# Altium schematic symbol library LATTICEPLDS_Library.SchLib: 291 symbols (part 16 of 32)
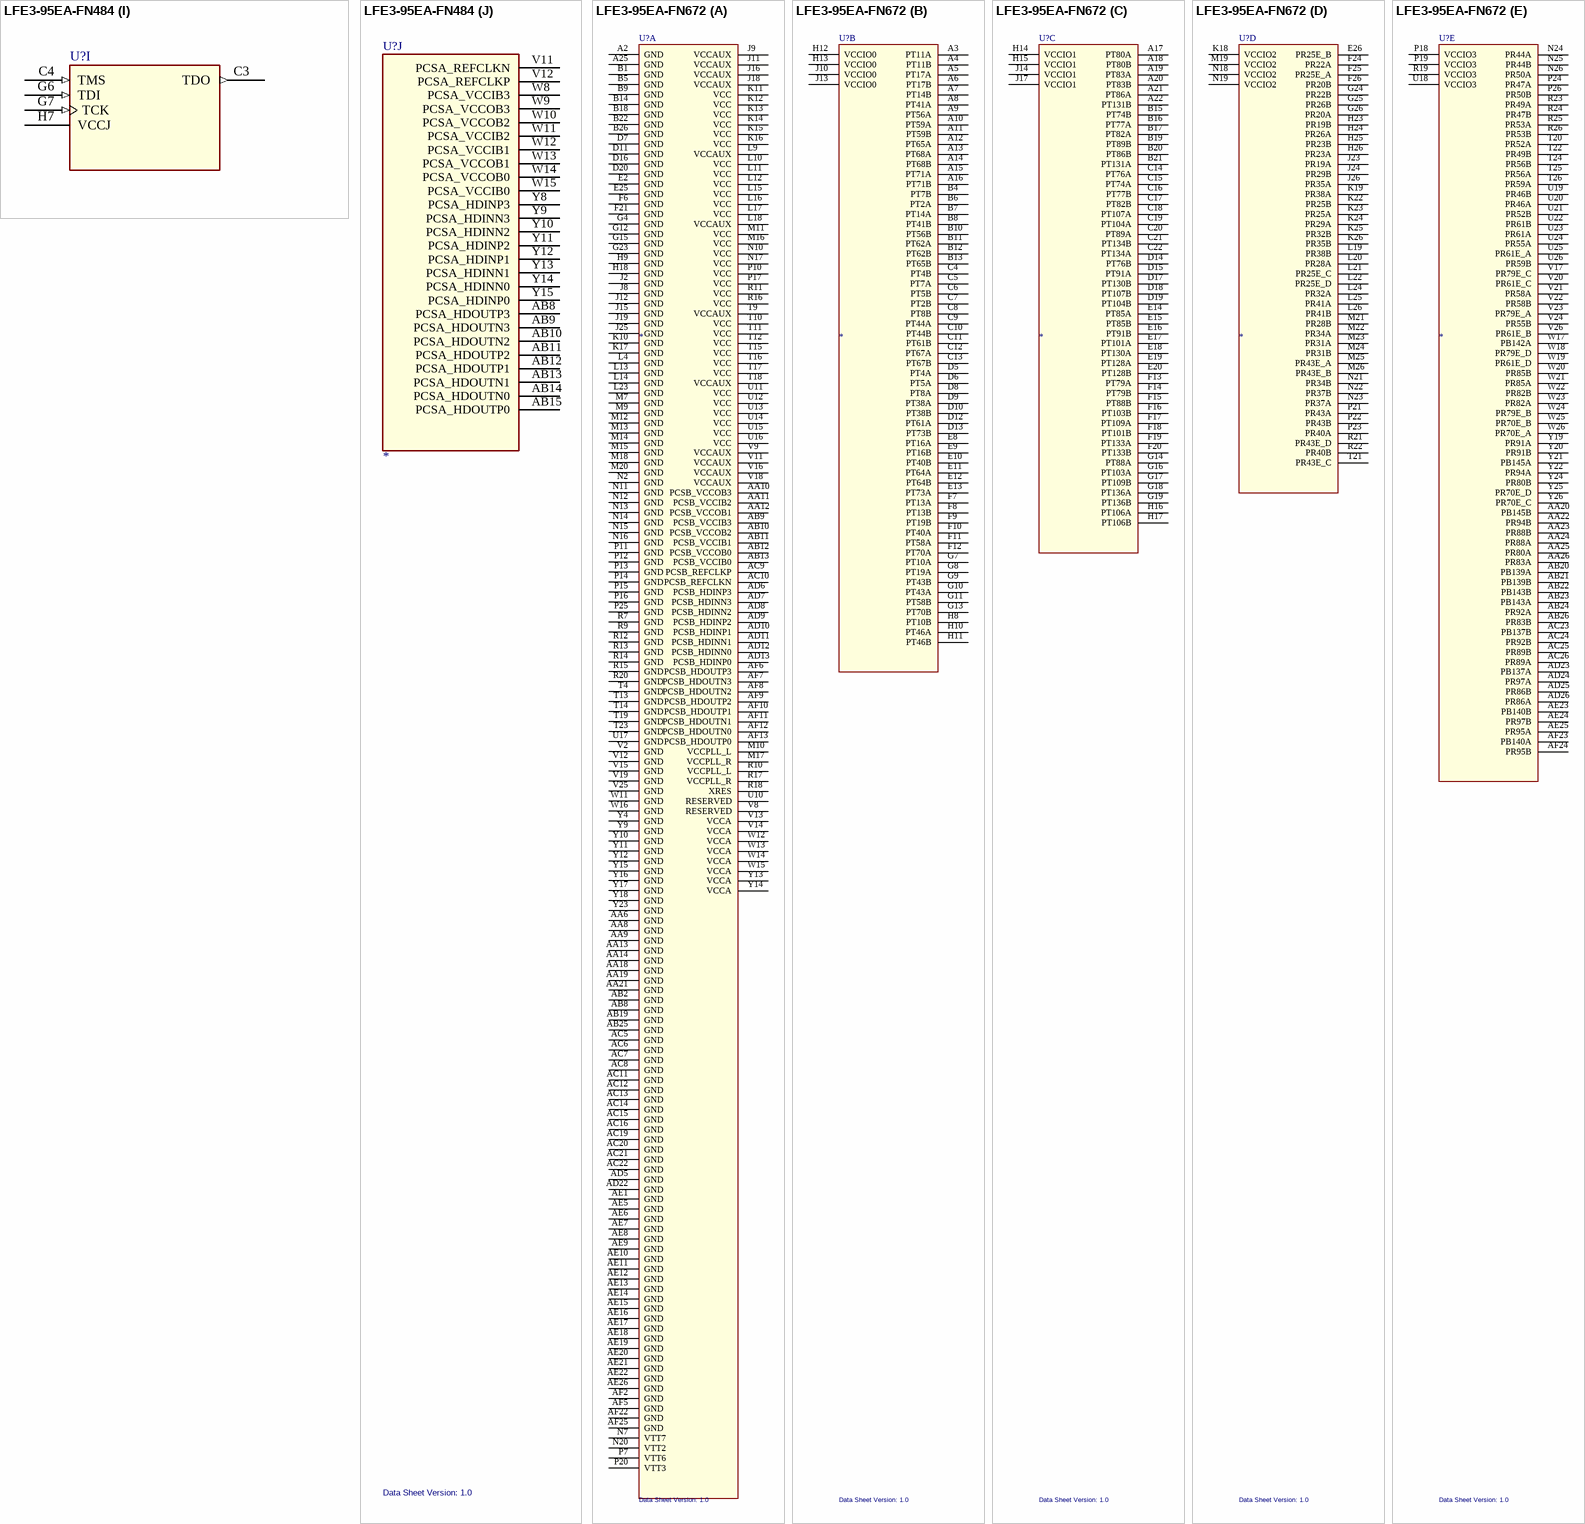
[diagram p318: symbols LFE3-95EA-FN484 to LFE3-95EA-FN672]

## LFE3-95EA-FN484
designator U?  Data Sheet Version: 1.0
SWAP_INFO: (S1+S2+S3+S4+S5+S6+S7+S8+S9+S10); SPLIT_INST: TRUE
part A pins: A1 GND (power), A22 GND (power), AA3 RESERVED, AA7 GND (power), AA8 GND (power), AA9 GND (power), AA10 GND (power), AA11 GND (power), AA12 GND (power), AA13 GND (power), AA14 GND (power), AA15 GND (power), AA16 GND (power), AA18 GND (power), AB1 GND (power), AB2 RESERVED, AB7 GND (power), AB16 GND (power), AB22 GND (power), B5 GND (power), B9 GND (power), B13 GND (power), B17 GND (power), C11 GND (power), C19 GND (power), D3 GND (power), E8 GND (power), E14 GND (power), E21 GND (power), F2 GND (power), F6 GND (power), F17 GND (power), G11 GND (power), G12 GND (power), H8 GND (power), H10 GND (power), H11 VCCAUX, H12 VCCAUX, H13 GND (power), H15 GND (power), H18 GND (power), J5 GND (power), J9 VCC, J10 VCC, J11 VCC, J12 VCC, J13 VCC, J14 VCC, J21 GND (power), K2 GND (power), K8 GND (power), K9 VCCPLL_L, K10 GND (power), K11 GND (power), K12 GND (power), K13 GND (power), K14 VCCPLL_R, K15 GND (power), L6 VTT7 (power), L7 GND (power), L8 VCCAUX, L9 VCC, L10 GND (power), L11 GND (power), L12 GND (power), L13 GND (power), L14 VCC, L15 VCCAUX, L16 GND (power), L17 VTT2 (power), L20 GND (power), M3 GND (power), M6 VTT6 (power), M7 GND (power), M8 VCCAUX, M9 VCC, M10 GND (power), M11 GND (power), M12 GND (power), M13 GND (power), M14 VCC, M15 VCCAUX, M16 GND (power), M17 VTT3 (power), N8 GND (power), N9 VCCPLL_L, N10 GND (power), N11 GND (power), N12 GND (power), N13 GND (power), N14 VCCPLL_R, N15 XRES, N21 GND (power), P2 GND (power), P9 VCC, P10 VCC, P11 VCC, P12 VCC, P13 VCC, P14 VCC, P16 GND (power), P18 GND (power), R5 GND (power), R8 GND (power), R10 GND (power), R11 VCCAUX, R12 VCCAUX, R13 GND (power), R15 GND (power), T10 GND (power), T11 GND (power), T12 GND (power), T13 GND (power), U6 GND (power), U9 GND (power), U10 GND (power), U11 VCCA, U12 VCCA, U13 GND (power), U14 GND (power), U17 GND (power), U21 GND (power), V2 GND (power), V7 GND (power), V8 GND (power), V9 GND (power), V10 VCCA, V13 VCCA, V14 GND (power), V15 GND (power), V16 GND (power), W7 GND (power), W16 GND (power), W20 GND (power), Y4 GND (power), Y7 GND (power), Y16 GND (power)
part B pins: A2 PT8B, A3 PT11A, A4 PT11B, A5 PT14A, A6 PT14B, A7 PT62B, A8 PT65B, A9 PT68A, A10 PT71A, A11 PT71B, B3 PT8A, B4 PT2B, B6 PT5B, B7 PT62A, B8 PT65A, B10 PT68B, C5 PT2A, C6 PT5A, C7 PT56B, C8 PT56A, C9 PT59A, C10 PT59B, D5 PT4B, D6 PT10A, D7 PT10B, D8 PT64A, D9 PT61A, D10 PT61B, D11 PT70B, E6 PT4A, E7 PT64B, E9 PT58B, E10 PT67B, E11 PT70A, F7 PT13A, F8 PT7A, F9 PT58A, F10 PT67A, F11 PT73A, F12 PT73B, G8 PT13B, G9 PT7B, G10 VCCIO0 (power), H9 VCCIO0 (power)
part C pins: A12 PT77A, A13 PT77B, A14 PT83A, A15 PT86A, A16 PT128A, A17 PT131A, A18 PT134A, A19 PT134B, B11 PT74A, B12 PT74B, B14 PT83B, B15 PT86B, B16 PT128B, B18 PT131B, C12 PT76A, C13 PT80A, C14 PT80B, C15 PT89A, C16 PT133B, C17 PT133A, D12 PT76B, D13 PT82A, D14 PT82B, D15 PT89B, D16 PT136A, D17 PT136B, E12 PT79A, E13 PT79B, E15 PT88B, E16 PT88A, F13 PT85A, F14 PT85B, F15 PT130A, F16 PT130B, G13 VCCIO1 (power), G14 PT91B, G15 PT91A, H14 VCCIO1 (power)
part D pins: E22 PR26A, F22 PR26B, G21 PR29A, G22 PR29B, H21 PR32A, H22 PR32B, J15 VCCIO2 (power), J17 PR28A, J18 PR28B, J19 PR31A, J20 PR31B, J22 PR35A, K16 VCCIO2 (power), K17 PR34A, K18 PR34B, K19 PR37B, K20 PR37A, K21 PR38A, K22 PR35B, L18 PR40A, L19 PR40B, L21 PR38B, L22 PR41A, M18 PR43E_C, M20 PR43B, M21 PR43A, M22 PR41B, N17 PR43E_D, N22 PR43E_B, P21 PR43E_A
part E pins: AA17 PB134B, AA19 PB143A, AA20 PR97A, AA21 PR94A, AA22 PR89A, AB17 PB134A, AB18 PB137A, AB19 PB137B, AB20 PR97B, AB21 PR89B, M19 PR46B, N16 VCCIO3 (power), N18 PR49A, N19 PR46A, N20 PR52B, P15 VCCIO3 (power), P17 PR55B, P19 PR49B, P20 PR52A, P22 PR44A, R14 PB136B, R16 PR55A, R17 PR61E_C, R18 PR61B, R19 PR61A, R20 PR50B, R21 PR44B, R22 PR47A, T14 PB136A, T15 PB145A, T16 PB145B, T17 PR61E_D, T18 PR91B, T19 PR91A, T20 PR50A, T21 PR58A, T22 PR47B, U15 PB133B, U16 PB133A, U18 PR92B, U19 PR92A, U20 PR58B, U22 PR53A, V17 PB142B, V18 PB142A, V19 PR95B, V20 PR61E_B, V21 PR61E_A, V22 PR53B, W17 PB139B, W18 PB139A, W19 PR95A, W21 PR59B, W22 PR56B, Y17 PB140A, Y18 PB140B, Y19 PB143B, Y20 PR94B, Y21 PR59A, Y22 PR56A
part F pins: AA1 PL92A, AA2 PL95B, AA4 PB5A, AA5 PB5B, AA6 PB11B, AB3 PB2A, AB4 PB2B, AB5 PB8A, AB6 PB8B, L2 PL44B, L3 PL44A, L4 PL46A, M1 PL47B, M2 PL47A, M4 PL46B, M5 PL49A, N1 PL50B, N2 PL50A, N3 PL53A, N4 PL52A, N5 PL55A, N6 PL49B, N7 VCCIO6 (power), P1 PL56A, P3 PL53B, P4 PL52B, P5 PL58A, P6 PL55B, P7 PL82B, P8 VCCIO6 (power), R1 PL56B, R2 PL59B, R3 PL59A, R4 PL88A, R6 PL58B, R7 PL85A, R9 PB16A, T1 PL61E_B, T2 PL61E_A, T3 PL61E_C, T4 PL91A, T5 PL88B, T6 PL94A, T7 PL85B, T8 PB13B, T9 PB16B, U1 PL61A, U2 PL61B, U3 PL61E_D, U4 PL91B, U5 PL94B, U7 PB10B, U8 PB13A, V1 PL83A, V3 PL86A, V4 PL97A, V5 PL97B, V6 PB10A, W1 PL83B, W2 PL89A, W3 PL86B, W4 PB4A, W5 PB7A, W6 PB7B, Y1 PL89B, Y2 PL92B, Y3 PL95A, Y5 PB4B, Y6 PB11A
part G pins: B1 PL29A, B2 PL11A, C1 PL29B, C2 PL11B, D1 PL14B, D2 PL14A, D4 PL8B, E1 PL34A, E2 PL26A, E3 PL8A, E4 PL10B, E5 PL10A, F1 PL34B, F3 PL26B, F4 PL13B, F5 PL13A, G1 PL35A, G2 PL32B, G3 PL32A, G4 PL16A, G5 PL16B, H1 PL35B, H2 PL38A, H3 PL38B, H4 PL28A, H5 PL31A, H6 PL31B, J1 PL41B, J2 PL41A, J3 PL40A, J4 PL28B, J6 PL37B, J7 PL37A, J8 VCCIO7 (power), K1 PL43E_A, K3 PL40B, K4 PL43A, K5 PL43B, K6 PL43E_D, K7 VCCIO7 (power), L1 PL43E_B, L5 PL43E_C
part H pins: A20 PT143A, A21 PR8A, B19 PT140B, B20 PT143B, B21 CFG2, B22 PR8B, C18 PT140A, C20 PROGRAMN, C21 PR5A, C22 PR11A, D18 PT145A, D19 PT145B, D20 INITN, D21 PR5B, D22 PR11B, E17 PT142B, E18 PT142A, E19 CFG1, E20 CFG0, F18 PR7B, F19 PR7A, F20 CCLK, F21 DONE, G16 VCCIO8 (power), G17 PR13A, G18 PR13B, G19 PR14A, G20 PR14B, H16 VCCIO8 (power), H17 PR10B, H19 PR16A, H20 PR16B, J16 PR10A
part I pins: C3 TDO (out), C4 TMS (in), G6 TDI (in), G7 TCK (in), H7 VCCJ (power)
part J pins: AB8 PCSA_HDOUTP3, AB9 PCSA_HDOUTN3, AB10 PCSA_HDOUTN2, AB11 PCSA_HDOUTP2, AB12 PCSA_HDOUTP1, AB13 PCSA_HDOUTN1, AB14 PCSA_HDOUTN0, AB15 PCSA_HDOUTP0, V11 PCSA_REFCLKN, V12 PCSA_REFCLKP, W8 PCSA_VCCIB3, W9 PCSA_VCCOB3, W10 PCSA_VCCOB2, W11 PCSA_VCCIB2, W12 PCSA_VCCIB1, W13 PCSA_VCCOB1, W14 PCSA_VCCOB0, W15 PCSA_VCCIB0, Y8 PCSA_HDINP3, Y9 PCSA_HDINN3, Y10 PCSA_HDINN2, Y11 PCSA_HDINP2, Y12 PCSA_HDINP1, Y13 PCSA_HDINN1, Y14 PCSA_HDINN0, Y15 PCSA_HDINP0

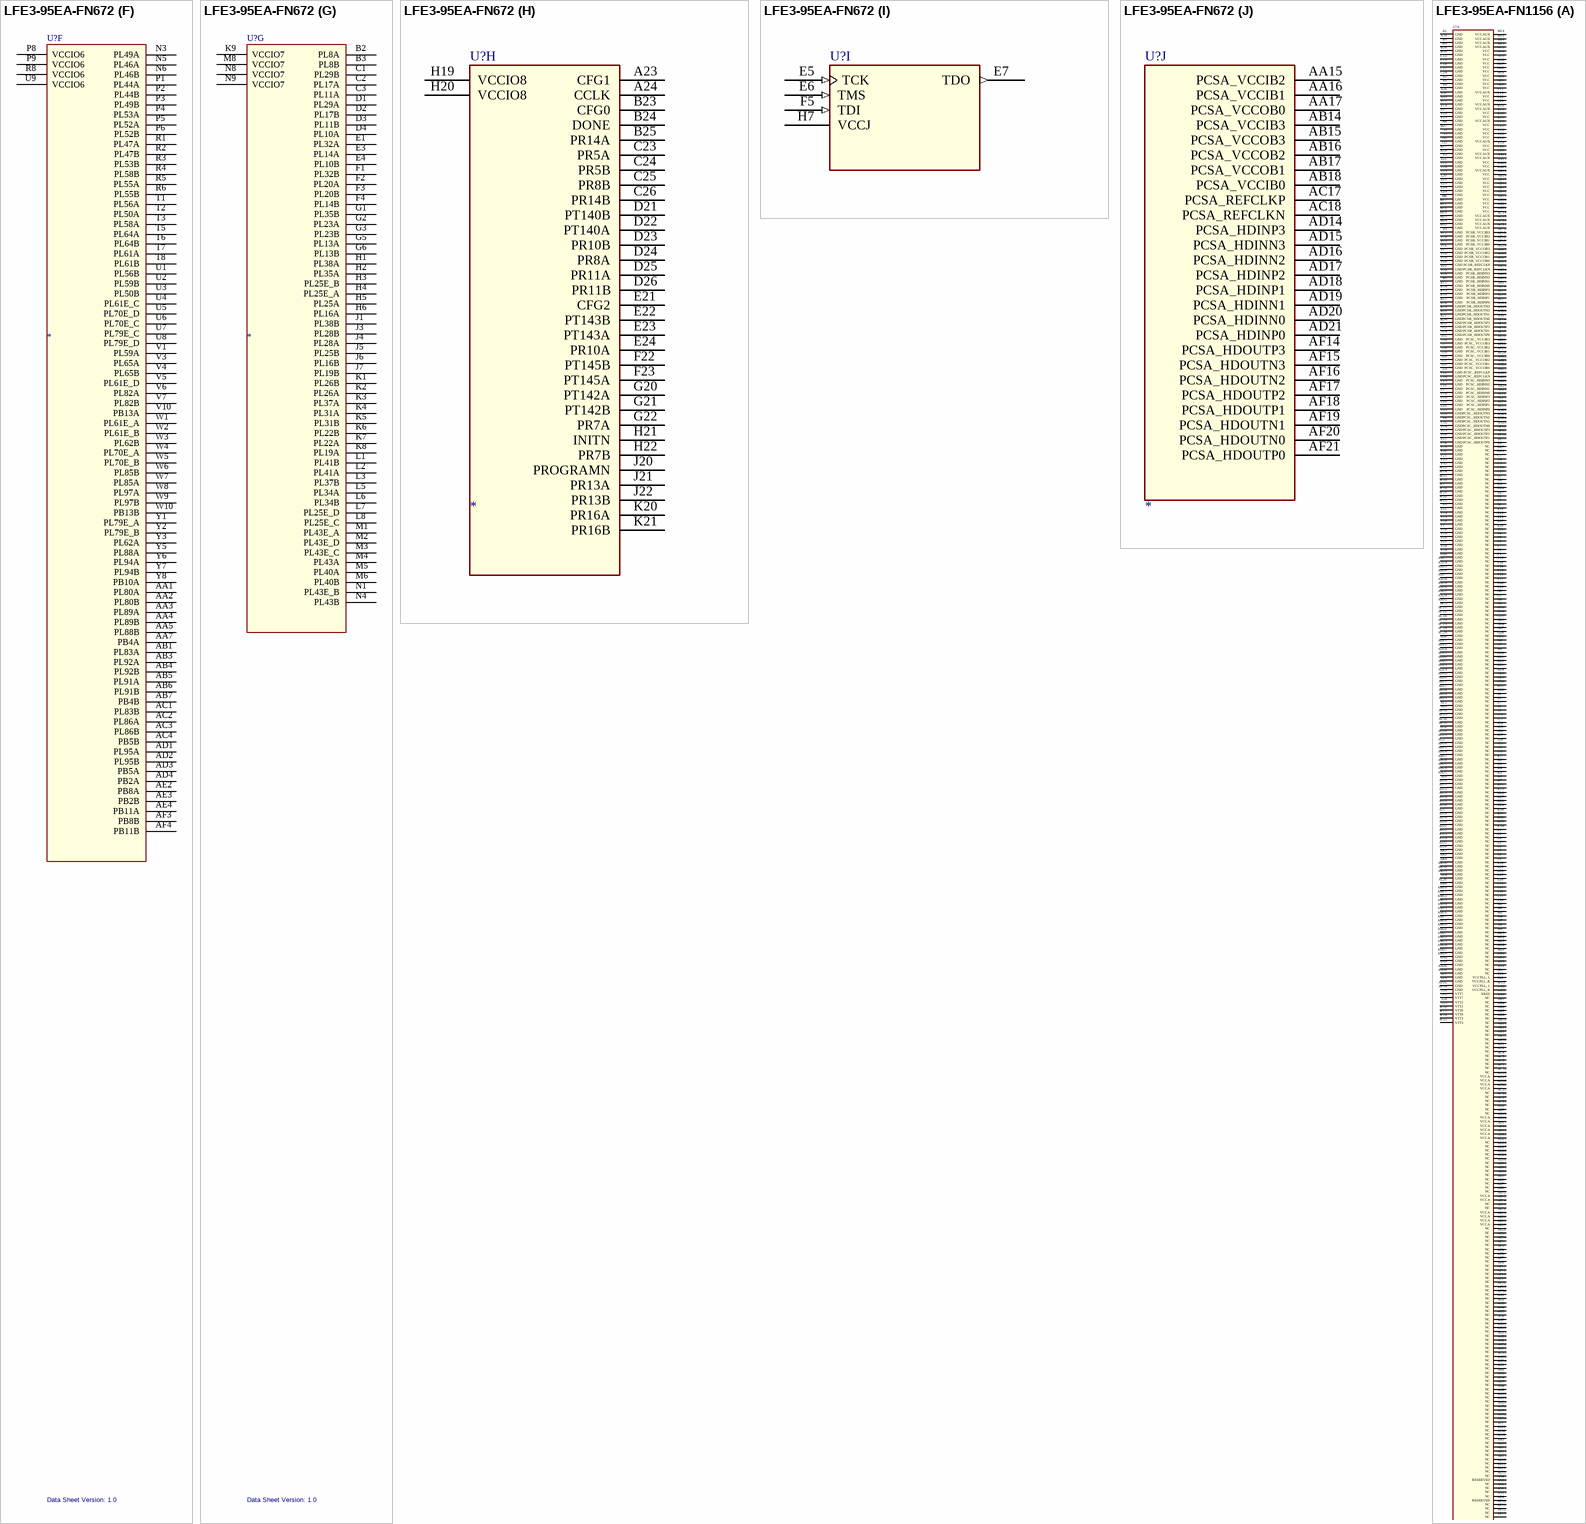
[diagram p151: symbols LFE3-95EA-FN672 to LFE3-95EA-FN1156]

## LFE3-95EA-FN672
designator U?  Data Sheet Version: 1.0
SWAP_INFO: (S1+S2+S3+S4+S5+S6+S7+S8+S9+S10); SPLIT_INST: TRUE
part A pins: A2 GND (power), A25 GND (power), AA6 GND (power), AA8 GND (power), AA9 GND (power), AA10 PCSB_VCCOB3, AA11 PCSB_VCCIB2, AA12 PCSB_VCCOB1, AA13 GND (power), AA14 GND (power), AA18 GND (power), AA19 GND (power), AA21 GND (power), AB2 GND (power), AB8 GND (power), AB9 PCSB_VCCIB3, AB10 PCSB_VCCOB2, AB11 PCSB_VCCIB1, AB12 PCSB_VCCOB0, AB13 PCSB_VCCIB0, AB19 GND (power), AB25 GND (power), AC5 GND (power), AC6 GND (power), AC7 GND (power), AC8 GND (power), AC9 PCSB_REFCLKP, AC10 PCSB_REFCLKN, AC11 GND (power), AC12 GND (power), AC13 GND (power), AC14 GND (power), AC15 GND (power), AC16 GND (power), AC19 GND (power), AC20 GND (power), AC21 GND (power), AC22 GND (power), AD5 GND (power), AD6 PCSB_HDINP3, AD7 PCSB_HDINN3, AD8 PCSB_HDINN2, AD9 PCSB_HDINP2, AD10 PCSB_HDINP1, AD11 PCSB_HDINN1, AD12 PCSB_HDINN0, AD13 PCSB_HDINP0, AD22 GND (power), AE1 GND (power), AE5 GND (power), AE6 GND (power), AE7 GND (power), AE8 GND (power), AE9 GND (power), AE10 GND (power), AE11 GND (power), AE12 GND (power), AE13 GND (power), AE14 GND (power), AE15 GND (power), AE16 GND (power), AE17 GND (power), AE18 GND (power), AE19 GND (power), AE20 GND (power), AE21 GND (power), AE22 GND (power), AE26 GND (power), AF2 GND (power), AF5 GND (power), AF6 PCSB_HDOUTP3, AF7 PCSB_HDOUTN3, AF8 PCSB_HDOUTN2, AF9 PCSB_HDOUTP2, AF10 PCSB_HDOUTP1, AF11 PCSB_HDOUTN1, AF12 PCSB_HDOUTN0, AF13 PCSB_HDOUTP0, AF22 GND (power), AF25 GND (power), B1 GND (power), B5 GND (power), B9 GND (power), B14 GND (power), B18 GND (power), B22 GND (power), B26 GND (power), D7 GND (power), D11 GND (power), D16 GND (power), D20 GND (power), E2 GND (power), E25 GND (power), F6 GND (power), F21 GND (power), G4 GND (power), G12 GND (power), G15 GND (power), G23 GND (power), H9 GND (power), H18 GND (power), J2 GND (power), J8 GND (power), J9 VCCAUX, J11 VCCAUX, J12 GND (power), J15 GND (power), J16 VCCAUX, J18 VCCAUX, J19 GND (power), J25 GND (power), K10 GND (power), K11 VCC, K12 VCC, K13 VCC, K14 VCC, K15 VCC, K16 VCC, K17 GND (power), L4 GND (power), L9 VCCAUX, L10 VCC, L11 VCC, L12 VCC, L13 GND (power), L14 GND (power), L15 VCC, L16 VCC, L17 VCC, L18 VCCAUX, L23 GND (power), M7 GND (power), M9 GND (power), M10 VCCPLL_L, M11 VCC, M12 GND (power), M13 GND (power), M14 GND (power), M15 GND (power), M16 VCC, M17 VCCPLL_R, M18 GND (power), M20 GND (power), N2 GND (power), N7 VTT7 (power), N10 VCC, N11 GND (power), N12 GND (power), N13 GND (power), N14 GND (power), N15 GND (power), N16 GND (power), N17 VCC, N20 VTT2 (power), P7 VTT6 (power), P10 VCC, P11 GND (power), P12 GND (power), P13 GND (power), P14 GND (power), P15 GND (power), P16 GND (power), P17 VCC, P20 VTT3 (power), P25 GND (power), R7 GND (power), R9 GND (power), R10 VCCPLL_L, R11 VCC, R12 GND (power), R13 GND (power), R14 GND (power), R15 GND (power), R16 VCC, R17 VCCPLL_R, R18 XRES, R20 GND (power), T4 GND (power), T9 VCCAUX, T10 VCC, T11 VCC, T12 VCC, T13 GND (power), T14 GND (power), T15 VCC, T16 VCC, T17 VCC, T18 VCCAUX, T19 GND (power), T23 GND (power), U10 RESERVED, U11 VCC, U12 VCC, U13 VCC, U14 VCC, U15 VCC, U16 VCC, U17 GND (power), V2 GND (power), V8 RESERVED, V9 VCCAUX, V11 VCCAUX, V12 GND (power), V13 VCCA, V14 VCCA, V15 GND (power), V16 VCCAUX, V18 VCCAUX, V19 GND (power), V25 GND (power), W11 GND (power), W12 VCCA, W13 VCCA, W14 VCCA, W15 VCCA, W16 GND (power), Y4 GND (power), Y9 GND (power), Y10 GND (power), Y11 GND (power), Y12 GND (power), Y13 VCCA, Y14 VCCA, Y15 GND (power), Y16 GND (power), Y17 GND (power), Y18 GND (power), Y23 GND (power)
part B pins: A3 PT11A, A4 PT11B, A5 PT17A, A6 PT17B, A7 PT14B, A8 PT41A, A9 PT56A, A10 PT59A, A11 PT59B, A12 PT65A, A13 PT68A, A14 PT68B, A15 PT71A, A16 PT71B, B4 PT7B, B6 PT2A, B7 PT14A, B8 PT41B, B10 PT56B, B11 PT62A, B12 PT62B, B13 PT65B, C4 PT4B, C5 PT7A, C6 PT5B, C7 PT2B, C8 PT8B, C9 PT44A, C10 PT44B, C11 PT61B, C12 PT67A, C13 PT67B, D5 PT4A, D6 PT5A, D8 PT8A, D9 PT38A, D10 PT38B, D12 PT61A, D13 PT73B, E8 PT16A, E9 PT16B, E10 PT40B, E11 PT64A, E12 PT64B, E13 PT73A, F7 PT13A, F8 PT13B, F9 PT19B, F10 PT40A, F11 PT58A, F12 PT70A, G7 PT10A, G8 PT19A, G9 PT43B, G10 PT43A, G11 PT58B, G13 PT70B, H8 PT10B, H10 PT46A, H11 PT46B, H12 VCCIO0 (power), H13 VCCIO0 (power), J10 VCCIO0 (power), J13 VCCIO0 (power)
part C pins: A17 PT80A, A18 PT80B, A19 PT83A, A20 PT83B, A21 PT86A, A22 PT131B, B15 PT74B, B16 PT77A, B17 PT82A, B19 PT89B, B20 PT86B, B21 PT131A, C14 PT76A, C15 PT74A, C16 PT77B, C17 PT82B, C18 PT107A, C19 PT104A, C20 PT89A, C21 PT134B, C22 PT134A, D14 PT76B, D15 PT91A, D17 PT130B, D18 PT107B, D19 PT104B, E14 PT85A, E15 PT85B, E16 PT91B, E17 PT101A, E18 PT130A, E19 PT128A, E20 PT128B, F13 PT79A, F14 PT79B, F15 PT88B, F16 PT103B, F17 PT109A, F18 PT101B, F19 PT133A, F20 PT133B, G14 PT88A, G16 PT103A, G17 PT109B, G18 PT136A, G19 PT136B, H14 VCCIO1 (power), H15 VCCIO1 (power), H16 PT106A, H17 PT106B, J14 VCCIO1 (power), J17 VCCIO1 (power)
part D pins: E26 PR25E_B, F24 PR22A, F25 PR25E_A, F26 PR20B, G24 PR22B, G25 PR26B, G26 PR20A, H23 PR19B, H24 PR26A, H25 PR23B, H26 PR23A, J23 PR19A, J24 PR29B, J26 PR35A, K18 VCCIO2 (power), K19 PR38A, K22 PR25B, K23 PR25A, K24 PR29A, K25 PR32B, K26 PR35B, L19 PR38B, L20 PR28A, L21 PR25E_C, L22 PR25E_D, L24 PR32A, L25 PR41A, L26 PR41B, M19 VCCIO2 (power), M21 PR28B, M22 PR34A, M23 PR31A, M24 PR31B, M25 PR43E_A, M26 PR43E_B, N18 VCCIO2 (power), N19 VCCIO2 (power), N21 PR34B, N22 PR37B, N23 PR37A, P21 PR43A, P22 PR43B, P23 PR40A, R21 PR43E_D, R22 PR40B, T21 PR43E_C
part E pins: AA20 PB145B, AA22 PR94B, AA23 PR88B, AA24 PR88A, AA25 PR80A, AA26 PR83A, AB20 PB139A, AB21 PB139B, AB22 PB143B, AB23 PB143A, AB24 PR92A, AB26 PR83B, AC23 PB137B, AC24 PR92B, AC25 PR89B, AC26 PR89A, AD23 PB137A, AD24 PR97A, AD25 PR86B, AD26 PR86A, AE23 PB140B, AE24 PR97B, AE25 PR95A, AF23 PB140A, AF24 PR95B, N24 PR44A, N25 PR44B, N26 PR50A, P18 VCCIO3 (power), P19 VCCIO3 (power), P24 PR47A, P26 PR50B, R19 VCCIO3 (power), R23 PR49A, R24 PR47B, R25 PR53A, R26 PR53B, T20 PR52A, T22 PR49B, T24 PR56B, T25 PR56A, T26 PR59A, U18 VCCIO3 (power), U19 PR46B, U20 PR46A, U21 PR52B, U22 PR61B, U23 PR61A, U24 PR55A, U25 PR61E_A, U26 PR59B, V17 PR79E_C, V20 PR61E_C, V21 PR58A, V22 PR58B, V23 PR79E_A, V24 PR55B, V26 PR61E_B, W17 PB142A, W18 PR79E_D, W19 PR61E_D, W20 PR85B, W21 PR85A, W22 PR82B, W23 PR82A, W24 PR79E_B, W25 PR70E_B, W26 PR70E_A, Y19 PR91A, Y20 PR91B, Y21 PB145A, Y22 PR94A, Y24 PR80B, Y25 PR70E_D, Y26 PR70E_C
part F pins: AA1 PL80A, AA2 PL80B, AA3 PL89A, AA4 PL89B, AA5 PL88B, AA7 PB4A, AB1 PL83A, AB3 PL92A, AB4 PL92B, AB5 PL91A, AB6 PL91B, AB7 PB4B, AC1 PL83B, AC2 PL86A, AC3 PL86B, AC4 PB5B, AD1 PL95A, AD2 PL95B, AD3 PB5A, AD4 PB2A, AE2 PB8A, AE3 PB2B, AE4 PB11A, AF3 PB8B, AF4 PB11B, N3 PL49A, N5 PL46A, N6 PL46B, P1 PL44A, P2 PL44B, P3 PL49B, P4 PL53A, P5 PL52A, P6 PL52B, P8 VCCIO6 (power), P9 VCCIO6 (power), R1 PL47A, R2 PL47B, R3 PL53B, R4 PL58B, R5 PL55A, R6 PL55B, R8 VCCIO6 (power), T1 PL56A, T2 PL50A, T3 PL58A, T5 PL64A, T6 PL64B, T7 PL61A, T8 PL61B, U1 PL56B, U2 PL59B, U3 PL50B, U4 PL61E_C, U5 PL70E_D, U6 PL70E_C, U7 PL79E_C, U8 PL79E_D, U9 VCCIO6 (power), V1 PL59A, V3 PL65A, V4 PL65B, V5 PL61E_D, V6 PL82A, V7 PL82B, V10 PB13A, W1 PL61E_A, W2 PL61E_B, W3 PL62B, W4 PL70E_A, W5 PL70E_B, W6 PL85B, W7 PL85A, W8 PL97A, W9 PL97B, W10 PB13B, Y1 PL79E_A, Y2 PL79E_B, Y3 PL62A, Y5 PL88A, Y6 PL94A, Y7 PL94B, Y8 PB10A
part G pins: B2 PL8A, B3 PL8B, C1 PL29B, C2 PL17A, C3 PL11A, D1 PL29A, D2 PL17B, D3 PL11B, D4 PL10A, E1 PL32A, E3 PL14A, E4 PL10B, F1 PL32B, F2 PL20A, F3 PL20B, F4 PL14B, G1 PL35B, G2 PL23A, G3 PL23B, G5 PL13A, G6 PL13B, H1 PL38A, H2 PL35A, H3 PL25E_B, H4 PL25E_A, H5 PL25A, H6 PL16A, J1 PL38B, J3 PL28B, J4 PL28A, J5 PL25B, J6 PL16B, J7 PL19B, K1 PL26B, K2 PL26A, K3 PL37A, K4 PL31A, K5 PL31B, K6 PL22B, K7 PL22A, K8 PL19A, K9 VCCIO7 (power), L1 PL41B, L2 PL41A, L3 PL37B, L5 PL34A, L6 PL34B, L7 PL25E_D, L8 PL25E_C, M1 PL43E_A, M2 PL43E_D, M3 PL43E_C, M4 PL43A, M5 PL40A, M6 PL40B, M8 VCCIO7 (power), N1 PL43E_B, N4 PL43B, N8 VCCIO7 (power), N9 VCCIO7 (power)
part H pins: A23 CFG1, A24 CCLK, B23 CFG0, B24 DONE, B25 PR14A, C23 PR5A, C24 PR5B, C25 PR8B, C26 PR14B, D21 PT140B, D22 PT140A, D23 PR10B, D24 PR8A, D25 PR11A, D26 PR11B, E21 CFG2, E22 PT143B, E23 PT143A, E24 PR10A, F22 PT145B, F23 PT145A, G20 PT142A, G21 PT142B, G22 PR7A, H19 VCCIO8 (power), H20 VCCIO8 (power), H21 INITN, H22 PR7B, J20 PROGRAMN, J21 PR13A, J22 PR13B, K20 PR16A, K21 PR16B
part I pins: E5 TCK (in), E6 TMS (in), E7 TDO (out), F5 TDI (in), H7 VCCJ (power)
part J pins: AA15 PCSA_VCCIB2, AA16 PCSA_VCCIB1, AA17 PCSA_VCCOB0, AB14 PCSA_VCCIB3, AB15 PCSA_VCCOB3, AB16 PCSA_VCCOB2, AB17 PCSA_VCCOB1, AB18 PCSA_VCCIB0, AC17 PCSA_REFCLKP, AC18 PCSA_REFCLKN, AD14 PCSA_HDINP3, AD15 PCSA_HDINN3, AD16 PCSA_HDINN2, AD17 PCSA_HDINP2, AD18 PCSA_HDINP1, AD19 PCSA_HDINN1, AD20 PCSA_HDINN0, AD21 PCSA_HDINP0, AF14 PCSA_HDOUTP3, AF15 PCSA_HDOUTN3, AF16 PCSA_HDOUTN2, AF17 PCSA_HDOUTP2, AF18 PCSA_HDOUTP1, AF19 PCSA_HDOUTN1, AF20 PCSA_HDOUTN0, AF21 PCSA_HDOUTP0

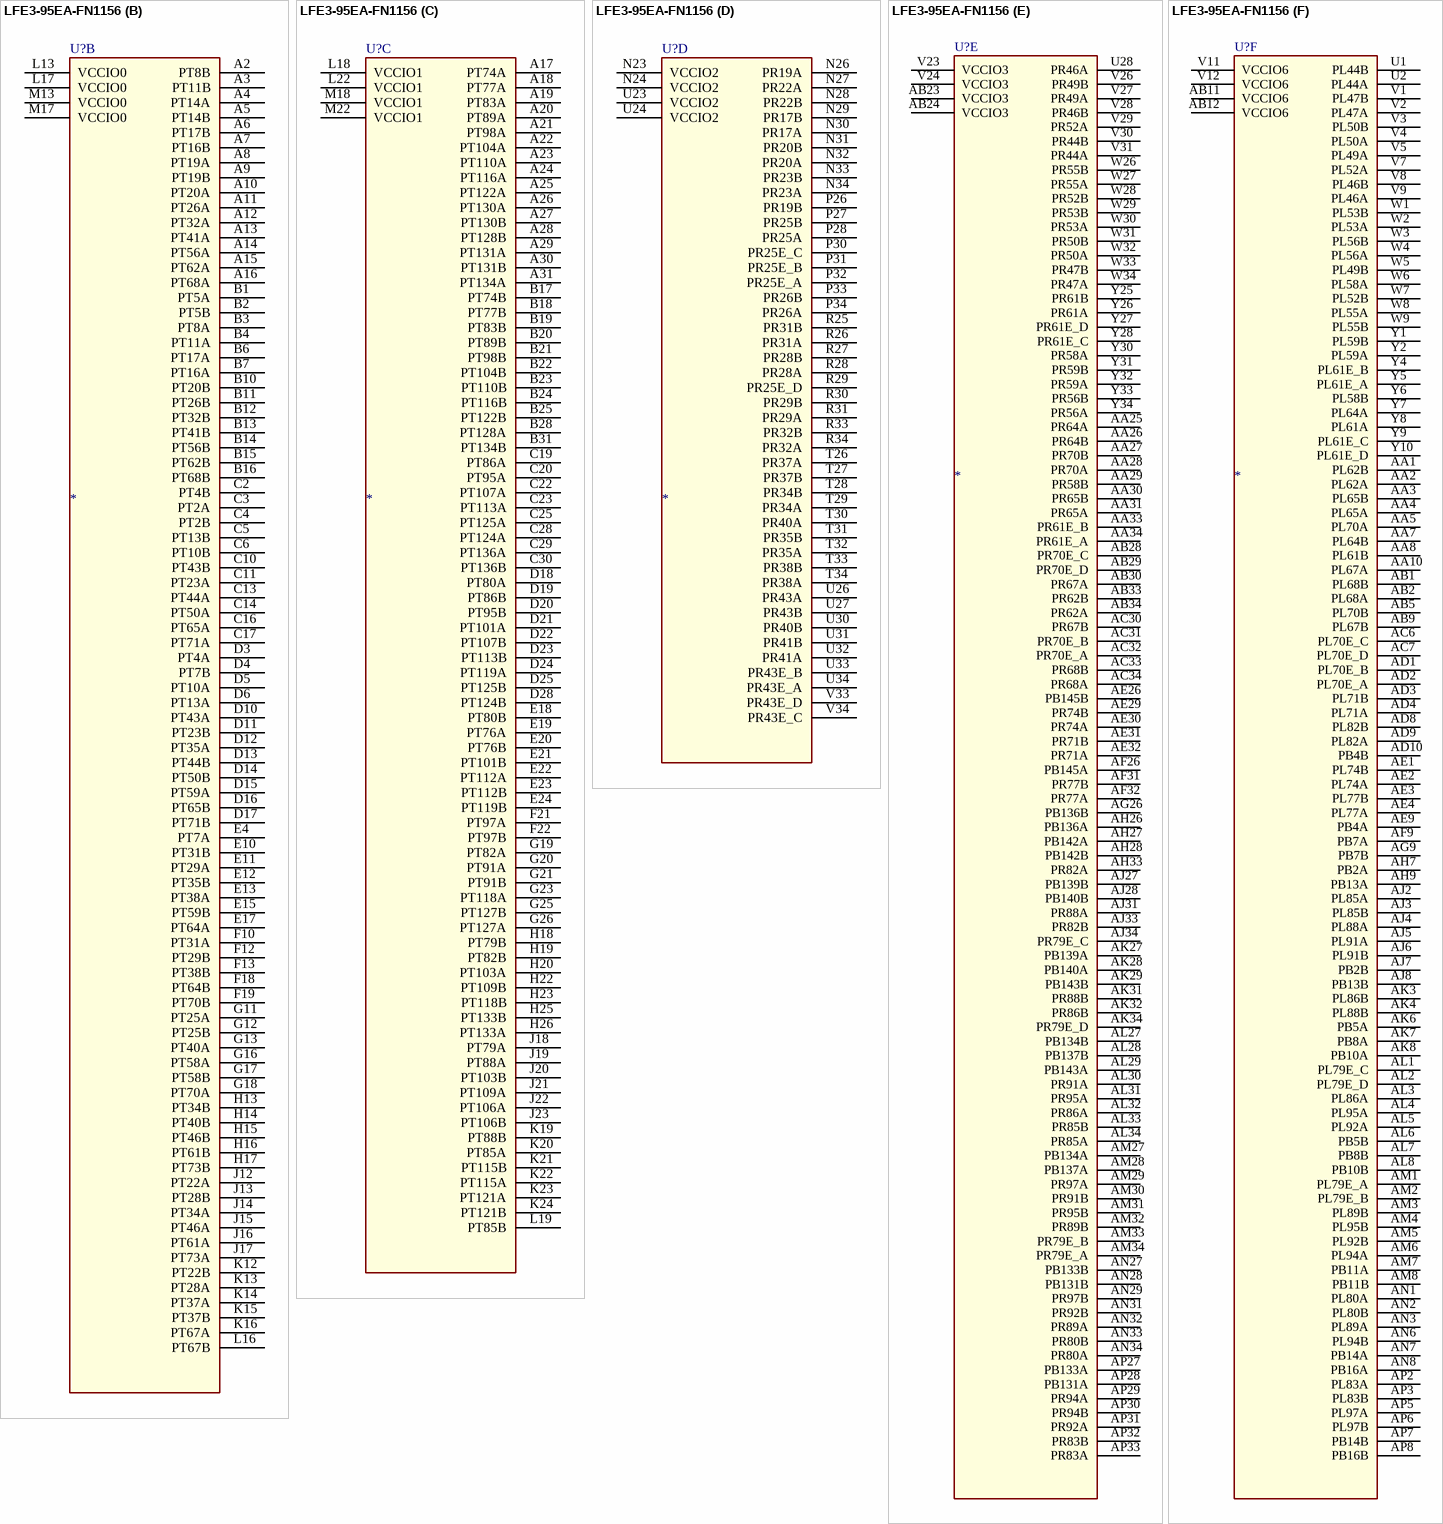
[diagram p152: symbol LFE3-95EA-FN1156]

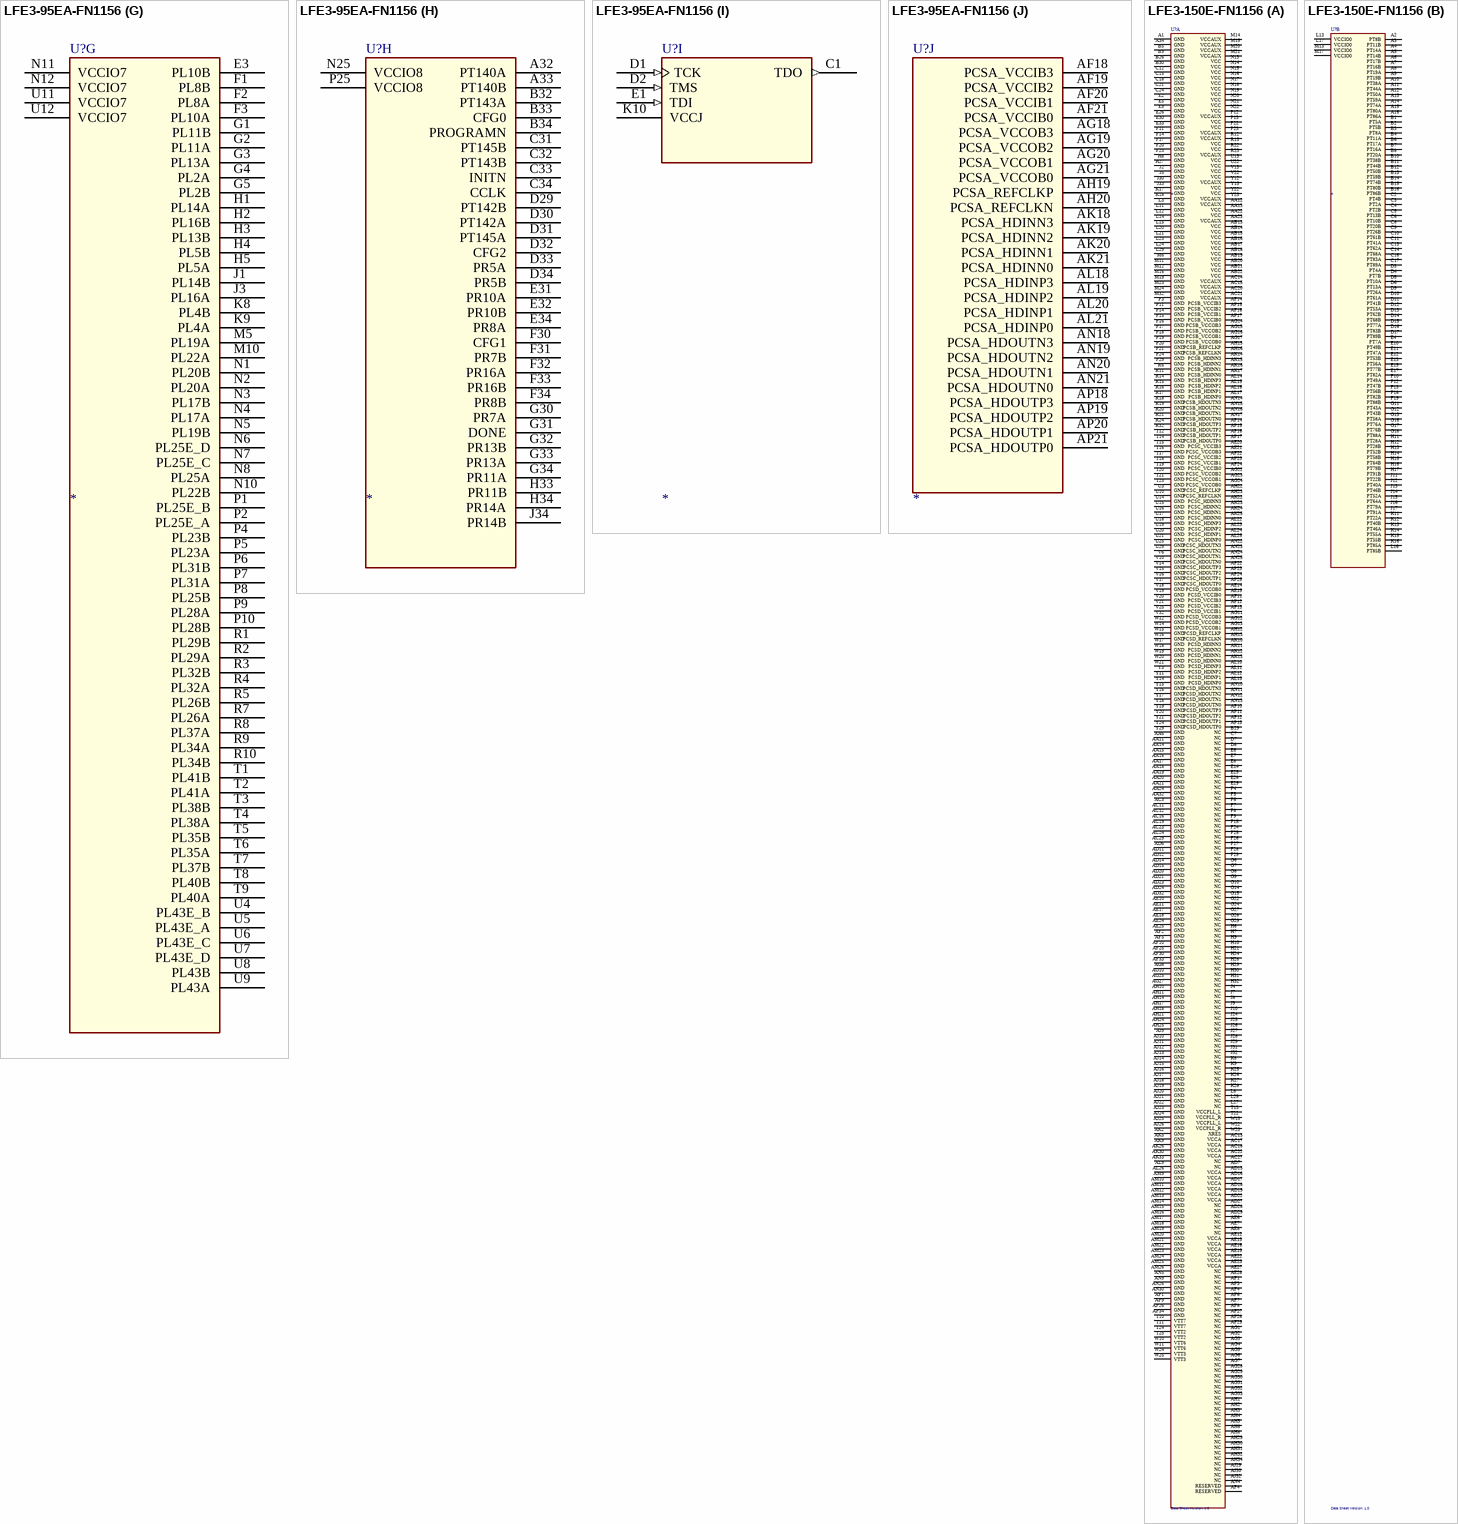
[diagram p153: symbols LFE3-95EA-FN1156 to LFE3-150E-FN1156]

## LFE3-95EA-FN1156
designator U?  Data Sheet Version: 1.0
SPLIT_INST: TRUE; SWAP_INFO: (S1+S2+S3+S4+S5+S6+S7+S8+S9+S10)
part A pins: A1 GND (power), A34 GND (power), AA6 GND (power), AA9 NC, AA11 GND (power), AA12 VCCAUX, AA13 VCC, AA14 GND (power), AA15 GND (power), AA16 GND (power), AA17 GND (power), AA18 GND (power), AA19 GND (power), AA20 GND (power), AA21 GND (power), AA22 VCC, AA23 VCCAUX, AA24 GND (power), AA32 GND (power), AB3 NC, AB4 NC, AB6 NC, AB7 NC, AB8 NC, AB10 NC, AB13 VCC, AB14 VCC, AB15 VCC, AB16 VCC, AB17 VCC, AB18 VCC, AB19 VCC, AB20 VCC, AB21 VCC, AB22 VCC, AB25 NC, AB26 NC, AB27 NC, AB31 NC, AB32 NC, AC1 NC, AC2 NC, AC3 GND (power), AC4 NC, AC5 NC, AC8 NC, AC9 NC, AC10 NC, AC11 GND (power), AC12 GND (power), AC13 VCCA, AC14 VCCAUX, AC15 VCCAUX, AC16 GND (power), AC17 VCCA, AC18 VCCA, AC19 GND (power), AC20 VCCAUX, AC21 VCCAUX, AC22 VCCA, AC23 GND (power), AC24 GND (power), AC25 NC, AC26 NC, AC27 NC, AC28 NC, AC29 GND (power), AD5 NC, AD6 GND (power), AD7 NC, AD11 GND (power), AD12 GND (power), AD13 VCCA, AD14 GND (power), AD15 GND (power), AD16 VCCA, AD17 VCCA, AD18 VCCA, AD19 VCCA, AD20 GND (power), AD21 GND (power), AD22 VCCA, AD23 GND (power), AD24 GND (power), AD25 NC, AD26 NC, AD27 NC, AD28 NC, AD29 NC, AD30 NC, AD31 NC, AD32 GND (power), AD33 NC, AD34 NC, AE5 NC, AE6 NC, AE7 NC, AE8 NC, AE10 GND (power), AE11 GND (power), AE12 VCCA, AE13 VCCA, AE14 NC, AE15 NC, AE16 VCCA, AE17 GND (power), AE18 GND (power), AE19 VCCA, AE20 PCSC_VCCIB3, AE21 PCSC_VCCOB3, AE22 VCCA, AE23 VCCA, AE24 GND (power), AE25 GND (power), AE27 NC, AE28 NC, AE33 NC, AE34 NC, AF1 NC, AF2 GND (power), AF3 NC, AF4 NC, AF5 GND (power), AF6 NC, AF7 NC, AF8 NC, AF10 GND (power), AF11 NC, AF12 NC, AF13 NC, AF14 PCSB_VCCIB3, AF15 PCSB_VCCIB2, AF16 PCSB_VCCIB1, AF17 PCSB_VCCIB0, AF22 PCSC_VCCIB2, AF23 PCSC_VCCIB1, AF24 PCSC_VCCIB0, AF25 GND (power), AF27 NC, AF28 NC, AF29 NC, AF30 GND (power), AF33 GND (power), AF34 NC, AG1 NC, AG2 NC, AG3 NC, AG4 NC, AG5 NC, AG6 NC, AG7 NC, AG8 GND (power), AG10 GND (power), AG11 NC, AG12 NC, AG13 NC, AG14 PCSB_VCCOB3, AG15 PCSB_VCCOB2, AG16 PCSB_VCCOB1, AG17 PCSB_VCCOB0, AG22 PCSC_VCCOB2, AG23 PCSC_VCCOB1, AG24 PCSC_VCCOB0, AG25 GND (power), AG27 GND (power), AG28 NC, AG29 NC, AG30 NC, AG31 NC, AG32 NC, AG33 NC, AG34 NC, AH1 NC, AH2 NC, AH3 NC, AH4 NC, AH5 NC, AH6 NC, AH8 NC, AH10 GND (power), AH11 GND (power), AH12 NC, AH13 NC, AH14 GND (power), AH15 PCSB_REFCLKP, AH16 PCSB_REFCLKN, AH17 GND (power), AH18 GND (power), AH21 GND (power), AH22 PCSC_REFCLKP, AH23 PCSC_REFCLKN, AH24 GND (power), AH25 GND (power), AH29 NC, AH30 NC, AH31 NC, AH32 NC, AH34 NC, AJ1 NC, AJ9 GND (power), AJ10 GND (power), AJ11 GND (power), AJ12 GND (power), AJ13 GND (power), AJ14 GND (power), AJ15 GND (power), AJ16 GND (power), AJ17 GND (power), AJ18 GND (power), AJ19 GND (power), AJ20 GND (power), AJ21 GND (power), AJ22 GND (power), AJ23 GND (power), AJ24 GND (power), AJ25 GND (power), AJ26 GND (power), AJ29 NC, AJ30 NC, AJ32 NC, AK1 NC, AK2 GND (power), AK5 GND (power), AK9 GND (power), AK10 NC, AK11 NC, AK12 NC, AK13 NC, AK14 PCSB_HDINN3, AK15 PCSB_HDINN2, AK16 PCSB_HDINN1, AK17 PCSB_HDINN0, AK22 PCSC_HDINN3, AK23 PCSC_HDINN2, AK24 PCSC_HDINN1, AK25 PCSC_HDINN0, AK26 GND (power), AK30 GND (power), AK33 GND (power), AL9 GND (power), AL10 NC, AL11 NC, AL12 NC, AL13 NC, AL14 PCSB_HDINP3, AL15 PCSB_HDINP2, AL16 PCSB_HDINP1, AL17 PCSB_HDINP0, AL22 PCSC_HDINP3, AL23 PCSC_HDINP2, AL24 PCSC_HDINP1, AL25 PCSC_HDINP0, AL26 GND (power), AM9 GND (power), AM10 GND (power), AM11 GND (power), AM12 GND (power), AM13 GND (power), AM14 GND (power), AM15 GND (power), AM16 GND (power), AM17 GND (power), AM18 GND (power), AM19 GND (power), AM20 GND (power), AM21 GND (power), AM22 GND (power), AM23 GND (power), AM24 GND (power), AM25 GND (power), AM26 GND (power), AN4 RESERVED, AN5 GND (power), AN9 GND (power), AN10 NC, AN11 NC, AN12 NC, AN13 NC, AN14 PCSB_HDOUTN3, AN15 PCSB_HDOUTN2, AN16 PCSB_HDOUTN1, AN17 PCSB_HDOUTN0, AN22 PCSC_HDOUTN3, AN23 PCSC_HDOUTN2, AN24 PCSC_HDOUTN1, AN25 PCSC_HDOUTN0, AN26 GND (power), AN30 GND (power), AP1 GND (power), AP4 RESERVED, AP9 GND (power), AP10 NC, AP11 NC, AP12 NC, AP13 NC, AP14 PCSB_HDOUTP3, AP15 PCSB_HDOUTP2, AP16 PCSB_HDOUTP1, AP17 PCSB_HDOUTP0, AP22 PCSC_HDOUTP3, AP23 PCSC_HDOUTP2, AP24 PCSC_HDOUTP1, AP25 PCSC_HDOUTP0, AP26 GND (power), AP34 GND (power), B5 GND (power), B8 NC, B9 GND (power), B26 GND (power), B27 NC, B29 NC, B30 GND (power), C7 NC, C8 NC, C9 NC, C12 GND (power), C15 GND (power), C18 GND (power), C21 GND (power), C24 GND (power), C26 NC, C27 NC, D7 NC, D8 NC, D9 NC, D26 NC, D27 NC, E2 GND (power), E5 GND (power), E6 NC, E7 NC, E8 NC, E9 GND (power), E14 NC, E16 NC, E25 NC, E26 GND (power), E27 NC, E28 NC, E29 NC, E30 GND (power), E33 GND (power), F4 NC, F5 NC, F6 NC, F7 NC, F8 NC, F9 NC, F11 GND (power), F14 GND (power), F15 NC, F16 NC, F17 GND (power), F20 GND (power), F23 GND (power), F24 NC, F25 NC, F26 NC, F27 NC, F28 NC, F29 NC, G6 NC, G7 NC, G8 NC, G9 NC, G10 NC, G14 NC, G15 NC, G22 NC, G24 NC, G27 NC, G28 NC, G29 NC, H6 NC, H7 NC, H8 GND (power), H9 NC, H10 NC, H11 NC, H12 NC, H21 NC, H24 NC, H27 GND (power), H28 NC, H29 NC, H30 NC, H31 NC, H32 NC, J2 GND (power), J4 NC, J5 GND (power), J6 NC, J7 NC, J8 NC, J9 NC, J10 NC, J11 NC, J24 NC, J25 NC, J26 NC, J27 NC, J28 NC, J29 NC, J30 GND (power), J31 NC, J32 NC, J33 GND (power), K1 NC, K2 NC, K3 NC, K4 NC, K5 NC, K6 NC, K7 NC, K11 NC, K17 GND (power), K18 GND (power), K25 NC, K26 NC, K27 NC, K28 NC, K29 NC, K30 NC, K31 NC, K32 NC, K33 NC, K34 NC, L1 NC, L2 NC, L3 GND (power), L4 NC, L5 NC, L6 NC, L7 NC, L8 NC, L9 NC, L10 NC, L11 GND (power), L12 GND (power), L14 GND (power), L15 GND (power), L20 GND (power), L21 GND (power), L23 GND (power), L24 GND (power), L25 NC, L26 NC, L27 NC, L28 NC, L29 GND (power), L30 NC, L31 NC, L32 NC, L33 NC, L34 NC, M1 NC, M2 NC, M3 NC, M4 NC, M6 GND (power), M7 NC, M8 NC, M9 NC, M11 GND (power), M12 GND (power), M14 VCCAUX, M15 VCCAUX, M16 GND (power), M19 GND (power), M20 VCCAUX, M21 VCCAUX, M23 GND (power), M24 GND (power), M25 NC, M26 NC, M27 NC, M28 NC, M29 NC, M30 NC, M31 NC, M32 GND (power), M33 NC, M34 NC, N9 NC, N13 VCC, N14 VCC, N15 VCC, N16 VCC, N17 VCC, N18 VCC, N19 VCC, N20 VCC, N21 VCC, N22 VCC, P3 GND (power), P11 GND (power), P12 VCCAUX, P13 VCC, P14 GND (power), P15 GND (power), P16 GND (power), P17 GND (power), P18 GND (power), P19 GND (power), P20 GND (power), P21 GND (power), P22 VCC, P23 VCCAUX, P24 GND (power), P29 GND (power), R6 GND (power), R11 GND (power), R12 VCCAUX, R13 VCC, R14 GND (power), R15 GND (power), R16 GND (power), R17 GND (power), R18 GND (power), R19 GND (power), R20 GND (power), R21 GND (power), R22 VCC, R23 VCCAUX, R24 GND (power), R32 GND (power), T10 VTT7 (power), T11 VTT7 (power), T12 GND (power), T13 VCCPLL_L, T14 GND (power), T15 GND (power), T16 GND (power), T17 GND (power), T18 GND (power), T19 GND (power), T20 GND (power), T21 GND (power), T22 VCCPLL_R, T23 GND (power), T24 VTT2 (power), T25 VTT2 (power), U3 GND (power), U10 GND (power), U13 VCC, U14 GND (power), U15 GND (power), U16 GND (power), U17 GND (power), U18 GND (power), U19 GND (power), U20 GND (power), U21 GND (power), U22 VCC, U25 GND (power), U29 GND (power), V6 GND (power), V10 GND (power), V13 VCC, V14 GND (power), V15 GND (power), V16 GND (power), V17 GND (power), V18 GND (power), V19 GND (power), V20 GND (power), V21 GND (power), V22 VCC, V25 GND (power), V32 GND (power), W10 VTT6 (power), W11 VTT6 (power), W12 GND (power), W13 VCCPLL_L, W14 GND (power), W15 GND (power), W16 GND (power), W17 GND (power), W18 GND (power), W19 GND (power), W20 GND (power), W21 GND (power), W22 VCCPLL_R, W23 XRES, W24 VTT3 (power), W25 VTT3 (power), Y3 GND (power), Y11 GND (power), Y12 VCCAUX, Y13 VCC, Y14 GND (power), Y15 GND (power), Y16 GND (power), Y17 GND (power), Y18 GND (power), Y19 GND (power), Y20 GND (power), Y21 GND (power), Y22 VCC, Y23 VCCAUX, Y24 GND (power), Y29 GND (power)